# Altium footprint library AMA4B_adapter_board.PcbLib: 84 footprints (part 5 of 6)
Each footprint in its own frame and in the unit in brackets; x right, y up, seen from the top. Pads: shape width x height; smd on the part's side, far side on the other; paste and mask are expansions set on the pad; w line width, h text height; cw(c..) or ccw(c..) is an arc to the next point about the centre after c.
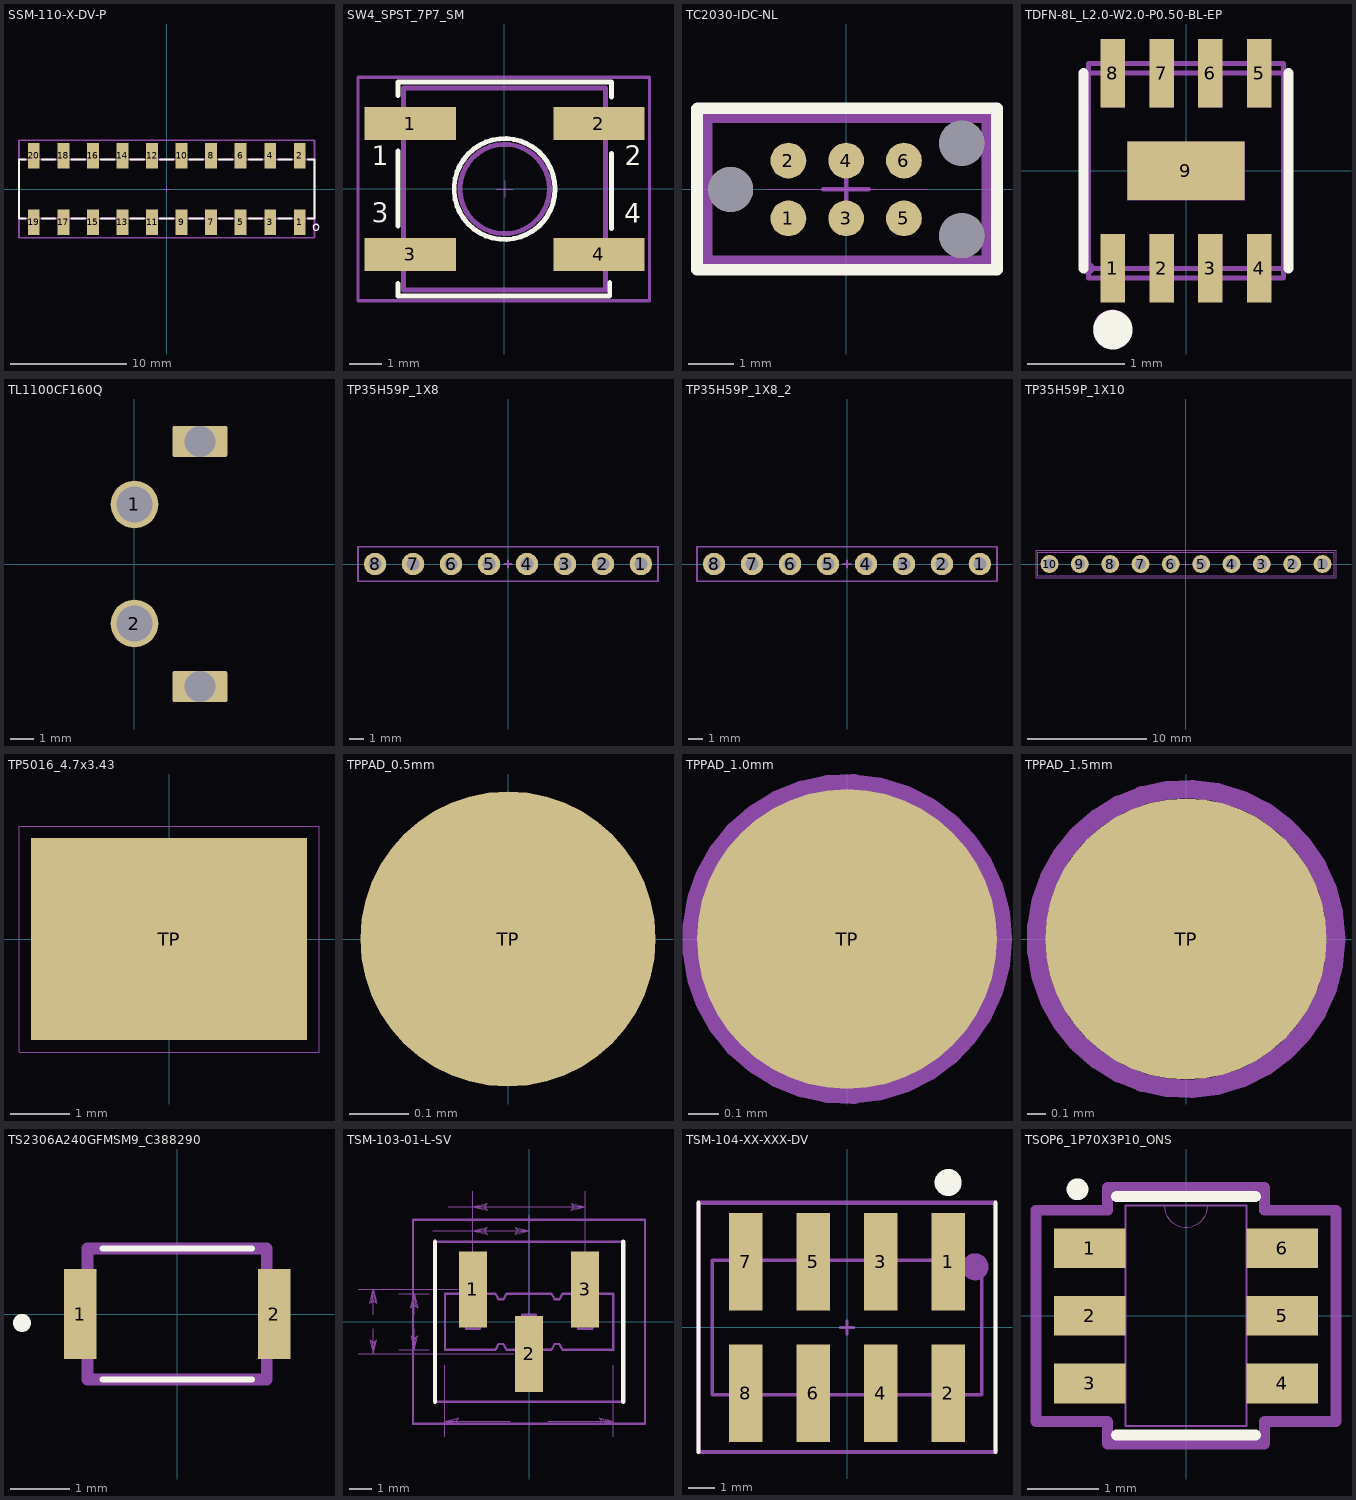
[diagram p4: the footprints below, top view; thin cyan lines are the x and y axes]

## SSM-110-X-DV-P [mil] "SSM-110-X-DV-P"
pads (20):
  rect 40.2x87.4 smd: 1(450,-112.5) 2(450,112.5) 3(350,-112.5) 4(350,112.5) 5(250,-112.5) 6(250,112.5) 7(150,-112.5) 8(150,112.5) 9(50,-112.5) 10(50,112.5) 11(-50,-112.5) 12(-50,112.5) 13(-150,-112.5) 14(-150,112.5) 15(-250,-112.5) 16(-250,112.5) 17(-350,-112.5) 18(-350,112.5) 19(-450,-112.5) 20(-450,112.5)
Top Overlay:
  circle w4: c505,-130 r10
  lines w6: -477.05,-100 -500,-100 -500,100 -477.05,100 ; -422.95,-100 -377.05,-100 ; -422.95,100 -377.05,100 ; -322.95,-100 -277.05,-100 ; -322.95,100 -277.05,100 ; -222.95,-100 -177.05,-100 ; -222.95,100 -177.05,100 ; -122.95,-100 -77.05,-100 ; -122.95,100 -77.05,100 ; -22.95,-100 22.95,-100 ; -22.95,100 22.95,100 ; 77.05,-100 122.95,-100 ; 77.05,100 122.95,100 ; 177.05,-100 222.95,-100 ; 177.05,100 222.95,100 ; 277.05,-100 322.95,-100 ; 277.05,100 322.95,100 ; 377.05,-100 422.95,-100 ; 377.05,100 422.95,100 ; 477.05,-100 500,-100 500,100 477.05,100
Board Shape:
  circle w4: c504.32,-126.26 r10
  lines w6: -500,-100 -500,100 500,100 500,-100 -500,-100
  text ".Designator" at -90.13,7.51 h40
Top Courtyard:
  lines w6: -500,-165 500,-165 500,165 -500,165 -500,-165
Top Component Center:
  lines w4: -10,0 10,0 ; 0,-10 0,10
3D body "SSM-110-L-DV-P.stp": height 338, standoff -4, extent -500,-138.5 500,138.5

## SW4_SPST_7P7_SM [mil]
pads (4):
  rect 110x40 smd: 1(-113.61,78.45) 2(114.39,78.45) 3(-113.61,-79.55) 4(114.39,-79.55)
Top Overlay:
  circle w6: c0.39,-0.55 r61
  lines w6: -128.61,-114.55 -128.61,-129.55 127.39,-129.55 127.39,-113.55 ; -128.61,-45.55 -128.61,45.45 ; -128.61,112.45 -128.61,128.45 129.39,128.45 129.39,110.45 ; 129.39,-48.55 129.39,42.45
  text "4" at 144.94,-49.25 h40
  text "2" at 145.67,20.16 h40
  text "3" at -160.24,-48.82 h40
  text "1" at -160.24,20.16 h40
Board Shape:
  circle w6: c0.39,-0.55 r54
  lines w6: -121.61,-122.55 122.39,-122.55 122.39,121.45 -121.61,121.45 -121.61,-122.55
  text ".Designator" at -64.61,84.45 h25
  text "3" at -166.54,-125.43 h25
  text "4" at 153.58,-124.92 h25
  text "2" at 155.63,106.61 h25
  text "1" at -166.02,107.13 h25
Top Courtyard:
  lines w4: -176.72,-135.55 175.31,-135.55 175.31,134.45 -176.72,134.45 -176.72,-135.55
Top Component Center:
  lines w1: -9.61,-0.55 10.39,-0.55 ; 0.39,-10.55 0.39,9.45
3D body "KSC441J70SHLFS.stp": height 204.53, standoff 0.04, extent -133.86,-124.02 133.86,124.02

## TC2030-IDC-NL [mil] "TC2030-IDC"
pads (9):
  round 30.98 smd paste+0 mask+1.97: 1(-50,-25)
  round 30.98 smd paste-39.37 mask+1.97: 2(-50,25) 3(0,-25) 4(0,25) 5(50,-25) 6(50,25)
  round 39.02 hole 39.02 unplated paste-39.37 mask+0: ""(-100,0) ""(100,-40) ""(100,40)
Top Layer keep-out:
  region: -69.6,0.39 70.31,0.39 70.31,-0.39 -69.6,-0.39
Top Overlay:
  lines w10: -129.09,-69.57 -129.09,69.91 -128.65,70.35 130.51,70.35 130.51,-69.57 -129.09,-69.57
Board Shape:
  text ".Designator" at -135.28,-13.37 h60
Top Courtyard:
  lines w10: -120.71,-62.28 121.93,-62.28 121.93,62.72 -120.71,62.72 -120.71,-62.28
Top Component Center:
  lines w3.94: -19.76,0.2 19.61,0.2 ; -0.08,-19.49 -0.08,19.88

## TDFN-8L_L2.0-W2.0-P0.50-BL-EP [mm]
pads (9):
  rect 0.25x0.7 smd: 1(-0.75,-1) 2(-0.25,-1) 3(0.25,-1) 4(0.75,-1) 5(0.75,1) 6(0.25,1) 7(-0.25,1) 8(-0.75,1)
  rect 1.2x0.6 smd: 9(0,-0.001)
Top Overlay:
  circle w0.3: c-0.75,-1.63 r0.051
  lines w0.102: -1.05,-1 -1.05,1 ; 1.05,-1 1.05,1
Top Assembly:
  circle w0.2: c-0.753,-1.624 r0.1
  lines w0.05: -1,-1.1 1,-1.1 1,1.1 -1,1.1 -1,-1.1
  text ".Designator" at -1.126,-0.113 h0.5
Top Courtyard:
  region: -0.94,-1 -0.94,-0.975 -0.975,-0.94 -1.025,-0.94 -1.06,-0.975 -1.06,-1 -1.06,-1.025 -1.025,-1.06 -0.975,-1.06 -0.94,-1.025
  region: 0.87,0.65 0.63,0.65 0.63,1 0.87,1
  region: 0.37,0.65 0.13,0.65 0.13,1 0.37,1
  region: -0.13,0.65 -0.37,0.65 -0.37,1 -0.13,1
  region: -0.63,0.65 -0.87,0.65 -0.87,1 -0.63,1
  region: -0.87,-0.65 -0.63,-0.65 -0.63,-1 -0.87,-1
  region: -0.37,-0.65 -0.13,-0.65 -0.13,-1 -0.37,-1
  region: 0.13,-0.65 0.37,-0.65 0.37,-1 0.13,-1
  region: -0.6,0.299 0.6,0.299 0.6,-0.301 -0.6,-0.301
  region: 0.63,-0.65 0.87,-0.65 0.87,-1 0.63,-1
  lines w0.051: -1,-1 -1,1 1,1 1,-1 -1,-1
3D body "MAX8902BATA+.stp": height 0.8, standoff 0, extent -1,-1.051 1,1.049

## TL1100CF160Q [mm]
pads (4):
  round 2 hole 1.5: 1(0,2.5) 2(0,-2.5)
  rrect10% 2.3x1.3 hole 1.3 square unplated: ""(2.75,-5.15) ""(2.75,5.15)
3D body "TL1100CF160Q v3.step": height 14.7, standoff -3.6, extent -9.965,-6.525 6.785,6.575

## TP35H59P_1X8 [mil] "TP35H59P_1X8"
pads (8):
  round 59 hole 35: 1(350,0) 2(250,0) 3(150,0) 4(50,0) 5(-50,0) 6(-150,0) 7(-250,0) 8(-350,0)
Board Shape:
  lines w4: -395,-45 395,-45 395,45 -395,45 -395,-45
  text "1" at 410,-12.85 h40
  text ".Designator" at 94.13,3.49 h40
  text "8" at -435,-12.63 h40
Top Courtyard:
  lines w4: -395,-45 395,-45 395,45 -395,45 -395,-45
Top Component Center:
  lines w4: -10,0 10,0 ; 0,-10 0,10

## TP35H59P_1X8_2 [mil]
pads (8):
  round 59 hole 35: 1(350,0) 2(250,0) 3(150,0) 4(50,0) 5(-50,0) 6(-150,0) 7(-250,0) 8(-350,0)
Board Shape:
  lines w4: -395,-45 -395,45 395,45 395,-45 -395,-45
  text "8" at -435,-12.63 h40
  text ".Designator" at 93.13,10.49 h40
  text "1" at 410,-12.85 h40
Top Courtyard:
  lines w4: -395,-45 -395,45 395,45 395,-45 -395,-45
Top Component Center:
  lines w4: -10,0 10,0 ; 0,-10 0,10

## TP35H59P_1X10 [mil] "TP35H59P_1X10"
pads (10):
  round 59 hole 35: 1(450,0) 2(350,0) 3(250,0) 4(150,0) 5(50,0) 6(-50,0) 7(-150,0) 8(-250,0) 9(-350,0) 10(-450,0)
Board Shape:
  lines w4: -494.51,-44.51 494.51,-44.51 494.51,44.51 -494.51,44.51 -494.51,-44.51
  text ".Designator" at -90.13,7.51 h40
  text "1" at 514.06,-12.85 h40
  text "10" at -543.43,-12.63 h40
Top Courtyard:
  lines w1: -489.5,-39.5 489.5,-39.5 489.5,39.5 -489.5,39.5 -489.5,-39.5
Top Component Center:
  lines w4: -10,0 10,0 ; 0,-10 0,10

## TP5016_4.7x3.43 [mm] "SMD Test point loop"
height 2.29
pads (1):
  rect 4.7x3.43 smd mask+0.05: TP(0,0)
Board Shape:
  lines w0.02: -1.905,-1.42 -1.905,1.42 1.905,1.42 1.905,-1.42 -1.905,-1.42
  text ".Designator" at 0.19,-0.813 h1.02
Top Courtyard:
  lines w0.02: -2.55,-1.925 2.55,-1.925 ; -2.55,-1.915 -2.55,1.915 2.55,1.915 2.55,-1.915
Top Component Center:
  lines w0.02: -0.052,-0.052 0,0 ; -0.052,0.052 0,0 ; 0.052,-0.052 0,0 ; 0.052,0.052 0,0
3D body "keystone-PN5016.STEP": height 2.5, standoff 0.21, extent -1.912,-1.434 1.898,1.422

## TPPAD_0.5mm [mm] "A 1.5mm Copper Pad Testpoint"
pads (1):
  round 0.5 smd paste-0.75: TP(0,0)

## TPPAD_1.0mm [mm] "A 1.5mm Copper Pad Testpoint"
pads (1):
  round 1 smd paste-0.75: TP(0,0)
Top Assembly:
  circle w0.1: c0,0 r0.5
  text ".Designator" at -1.126,-0.113 h0.5

## TPPAD_1.5mm [mm] "A 1.5mm Copper Pad Testpoint"
pads (1):
  round 1.5 smd paste-0.75: TP(0,0)
Top Assembly:
  circle w0.1: c0,0 r0.8
  text "Test point. DNP." at -0.838,-0.464 h0.25
  text ".Designator" at -1.126,-0.113 h0.5
3D body: height 0.1, standoff 0, extent -0.75,-0.75 0.75,0.75

## TS2306A240GFMSM9_C388290 [mm]
pads (2):
  rect 0.55x1.5 smd: 1(-1.625,0) 2(1.625,0)
Top Overlay:
  lines w0.1: -1.25,-1.1 1.25,-1.1 -1.25,-1.1 ; -1.25,1.1 1.25,1.1 -1.25,1.1
  lines w0.2: -2.6,-0.2 cw(c-2.6,-0.15) -2.6,-0.1 ; -2.6,-0.2 ccw(c-2.6,-0.15) -2.6,-0.1 ; -2.6,-0.2 cw(c-2.6,-0.15) -2.6,-0.1
Top 3D Body:
  lines w0.2: -1.5,-1.1 1.5,-1.1 1.5,1.1 -1.5,1.1 -1.5,-1.1
3D body "TS2306A-240GF-MSM-9_C388290.stp": height 1.1, standoff 0, extent -1.845,-1.1 1.845,1.1

## TSM-103-01-L-SV [mm]
pads (3):
  rect 1.27x3.43 smd: 1(-2.54,1.46) 2(0,-1.46) 3(2.54,1.46)
Top Overlay:
  lines w0.2: -4.26,-3.627 -4.26,3.626 ; 4.26,-3.627 4.26,3.626
Top Paste:
  region: 3.175,-0.255 1.905,-0.255 1.905,3.175 3.175,3.175
  region: 0.635,-3.175 -0.635,-3.175 -0.635,0.255 0.635,0.255
  region: -1.905,-0.255 -3.175,-0.255 -3.175,3.175 -1.905,3.175
Top Solder:
  region: 3.226,-0.306 1.854,-0.306 1.854,3.226 3.226,3.226
  region: 0.686,-3.226 -0.686,-3.226 -0.686,0.306 0.686,0.306
  region: -1.854,-0.306 -3.226,-0.306 -3.226,3.226 -1.854,3.226
Board Shape:
  lines w0.1: -2.856,1.27 -2.856,2.642 -2.221,2.642 -2.221,1.27 ; -0.319,-1.27 -0.319,-2.642 0.316,-2.642 0.316,-1.27 ; 1.27,-1.016 1.376,-1.016 1.523,-1.27 3.81,-1.27 3.81,-1.016 3.81,1.016 3.81,1.27 1.523,1.27 1.376,1.016 1.27,1.016 ; 1.271,-1.016 1.164,-1.016 1.017,-1.27 -1.017,-1.27 -1.164,-1.016 -1.27,-1.016 -1.376,-1.016 -1.523,-1.27 -3.81,-1.27 -3.81,-1.016 -3.81,1.016 -3.81,1.27 -1.523,1.27 -1.376,1.016 -1.27,1.016 -1.164,1.016 -1.017,1.27 1.017,1.27 1.164,1.016 1.271,1.016 ; 2.224,1.27 2.224,2.642 2.859,2.642 2.859,1.27 ; -4.26,-3.627 4.26,-3.627 4.26,3.626 -4.26,3.626 -4.26,-3.627 ; -2.856,-0.318 -2.856,0.318 -2.221,0.318 -2.221,-0.318 -2.856,-0.318 ; -0.319,-0.318 0.316,-0.318 0.316,0.318 -0.319,0.318 -0.319,-0.318 ; 2.224,-0.318 2.224,0.318 2.859,0.318 2.859,-0.318 2.224,-0.318
  text "1" at -3.2,2.54 h1.27
  text "3" at 3.912,2.489 h1.27
  text ".Designator" at -3.391,-3.226 h1.02
Top Assembly:
  lines w0: -7.75,-1.46 -0.701,-1.46 ; -7.75,1.46 -3.241,1.46 ; -7.048,-0.318 -7.048,-1.46 ; -7.048,0.318 -7.048,1.46 ; -5.908,-1.27 -4.511,-1.27 ; -5.908,1.27 -4.511,1.27 ; -5.207,-0.318 -5.207,-1.27 ; -5.207,0.318 -5.207,1.27 ; -4.356,4.128 -2.54,4.128 ; -3.81,-5.21 -3.81,-1.971 ; -3.658,5.207 -2.54,5.207 ; -2.54,4.829 -2.54,2.162 -2.54,5.908 ; -0.851,-4.508 -3.81,-4.508 ; 0,-0.759 0,4.829 ; 0.851,-4.508 3.81,-4.508 ; 2.54,2.162 2.54,5.908 ; 3.81,-5.21 3.81,-1.971 ; -7.207,-0.826 -7.048,-1.46 ; -7.207,-0.826 -7.048,-0.952 ; -7.207,-0.826 -7.128,-0.889 -7.048,-1.46 ; -7.048,-1.46 -6.89,-0.826 -7.048,-0.952 ; -7.048,-1.46 -6.969,-0.889 -7.048,-0.952 ; -7.048,-1.46 -7.048,-0.952 ; -7.048,0.952 -7.207,0.826 -7.048,1.46 ; -7.048,0.952 -6.89,0.826 ; -7.048,0.952 -7.128,0.889 -7.048,1.46 ; -7.048,0.952 -7.048,1.46 ; -7.048,1.46 -6.89,0.826 ; -7.048,1.46 -6.969,0.889 -6.89,0.826 ; -5.366,-0.635 -5.207,-1.27 ; -5.366,-0.635 -5.207,-0.762 ; -5.366,-0.635 -5.286,-0.698 -5.207,-1.27 ; -5.207,-1.27 -5.048,-0.635 -5.207,-0.762 ; -5.207,-1.27 -5.128,-0.698 -5.207,-0.762 ; -5.207,-1.27 -5.207,-0.762 ; -5.207,0.762 -5.366,0.635 -5.207,1.27 ; -5.207,0.762 -5.048,0.635 ; -5.207,0.762 -5.286,0.698 -5.207,1.27 ; -5.207,0.762 -5.207,1.27 ; -5.207,1.27 -5.048,0.635 ; -5.207,1.27 -5.128,0.698 -5.048,0.635 ; -3.81,-4.508 -3.175,-4.35 ; -3.81,-4.508 -3.175,-4.667 -3.302,-4.508 ; -3.81,-4.508 -3.238,-4.588 -3.302,-4.508 ; -3.81,-4.508 -3.302,-4.508 ; -3.81,-4.508 -3.238,-4.429 -3.175,-4.35 ; -3.302,-4.508 -3.175,-4.35 ; -2.54,4.128 -1.905,4.286 ; -2.54,4.128 -1.905,3.969 -2.032,4.128 ; -2.54,4.128 -1.968,4.048 -2.032,4.128 ; -2.54,4.128 -2.032,4.128 ; -2.54,4.128 -1.968,4.207 -1.905,4.286 ; -2.54,4.128 0,4.128 ; -2.54,5.207 -1.905,5.366 ; -2.54,5.207 -1.905,5.048 -2.032,5.207 ; -2.54,5.207 -1.968,5.128 -2.032,5.207 ; -2.54,5.207 -2.032,5.207 ; -2.54,5.207 -1.968,5.286 -1.905,5.366 ; -2.54,5.207 2.54,5.207 ; -2.032,4.128 -1.905,4.286 ; -2.032,5.207 -1.905,5.366 ; -0.635,3.969 0,4.128 ; -0.635,3.969 -0.508,4.128 ; -0.635,3.969 -0.572,4.048 0,4.128 ; -0.508,4.128 -0.635,4.286 0,4.128 ; -0.508,4.128 -0.572,4.207 0,4.128 ; -0.508,4.128 0,4.128 ; 1.905,5.048 2.54,5.207 ; 1.905,5.048 2.032,5.207 ; 1.905,5.048 1.968,5.128 2.54,5.207 ; 2.032,5.207 1.905,5.366 2.54,5.207 ; 2.032,5.207 1.968,5.286 2.54,5.207 ; 2.032,5.207 2.54,5.207 ; 3.175,-4.667 3.81,-4.508 ; 3.175,-4.667 3.302,-4.508 ; 3.175,-4.667 3.238,-4.588 3.81,-4.508 ; 3.302,-4.508 3.175,-4.35 3.81,-4.508 ; 3.302,-4.508 3.238,-4.429 3.81,-4.508 ; 3.302,-4.508 3.81,-4.508
  text "2.921" at -7.709,-0.127 h0.25
  text "2.540" at -5.867,-0.127 h0.25
  text "2.540" at -5.867,4 h0.25
  text "5.080" at -5.169,5.08 h0.25
  text "7.620" at -0.66,-4.636 h0.25
Top Courtyard:
  lines w0.102: -5.257,-4.624 5.257,-4.624 5.257,4.623 -5.257,4.623 -5.257,-4.624
Top Component Center:
  lines w0.051: -0.254,0 0.254,0 ; 0,-0.254 0,0.254
3D body "TSM-103-01-L-SV.stp": height 9.65, standoff 0, extent -3.81,-2.642 3.81,2.642

## TSM-104-XX-XXX-DV [mil] "TSM-104-XX-XXX-DV"
pads (8):
  rect 50x145 smd: 1(150,97.5) 2(150,-97.5) 3(50,97.5) 4(50,-97.5) 5(-50,97.5) 6(-50,-97.5) 7(-150,97.5) 8(-150,-97.5)
Top Overlay:
  circle w20: c150,215 r10
  lines w6: -220,-185 -220,185 ; 220,-185 220,185
Board Shape:
  circle w20: c190,90 r10
  lines w5: -200,-100 -200,100 200,100 200,-100 -200,-100
  text ".Designator" at 98.13,2.49 h40
Top Courtyard:
  lines w5.98: -220,-185 220,-185 ; -220,185 220,185
  lines w6: -220,-185 -220,185 ; 220,-185 220,185
Top Component Center:
  lines w4: -10,0 10,0 ; 0,-10 0,10
3D body "TSM-104-01-X-DV.step": height 380, standoff 0, extent -200,-145 200,145

## TSOP6_1P70X3P10_ONS [mil]
pads (6):
  rect 39.5x22 smd paste+0 mask+0: 1(-53.25,37.4) 2(-53.25,0) 3(-53.25,-37.4) 4(53.25,-37.4) 5(53.25,0) 6(53.25,37.4)
Top Overlay:
  circle w8: c-60,70 r2
  lines w6: -38.5,-66 38.5,-66 ; -38.5,66 38.5,66
Board Shape:
  lines w0: -12,61 ccw(c0,61) 12,61
  lines w1: -59,-47.4 -59,-27.4 -33.5,-27.4 -33.5,-47.4 -59,-47.4 ; -59,-10 -59,10 -33.5,10 -33.5,-10 -59,-10 ; -59,27.4 -59,47.4 -33.5,47.4 -33.5,27.4 -59,27.4 ; -33.5,-61 -33.5,61 33.5,61 33.5,-61 -33.5,-61 ; 33.5,-47.4 33.5,-27.4 59,-27.4 59,-47.4 33.5,-47.4 ; 33.5,-10 33.5,10 59,10 59,-10 33.5,-10 ; 33.5,27.4 33.5,47.4 59,47.4 59,27.4 33.5,27.4
  text ".Designator" at -43.07,-10.52 h20
Top Courtyard:
  lines w6: -83,-58.4 -43.5,-58.4 -43.5,-71 43.5,-71 43.5,-58.4 83,-58.4 83,58.4 43.5,58.4 43.5,71 -43.5,71 -43.5,58.4 -83,58.4 -83,-58.4
3D body: height 10, standoff 0, extent -33.55,-60.91 33.53,61.03